# Altium footprint library B105connectors.PcbLib: 71 footprints (part 2 of 5)
Each footprint in its own frame and in the unit in brackets; x right, y up, seen from the top. Pads: shape width x height; smd on the part's side, far side on the other; paste and mask are expansions set on the pad; w line width, h text height; cw(c..) or ccw(c..) is an arc to the next point about the centre after c.
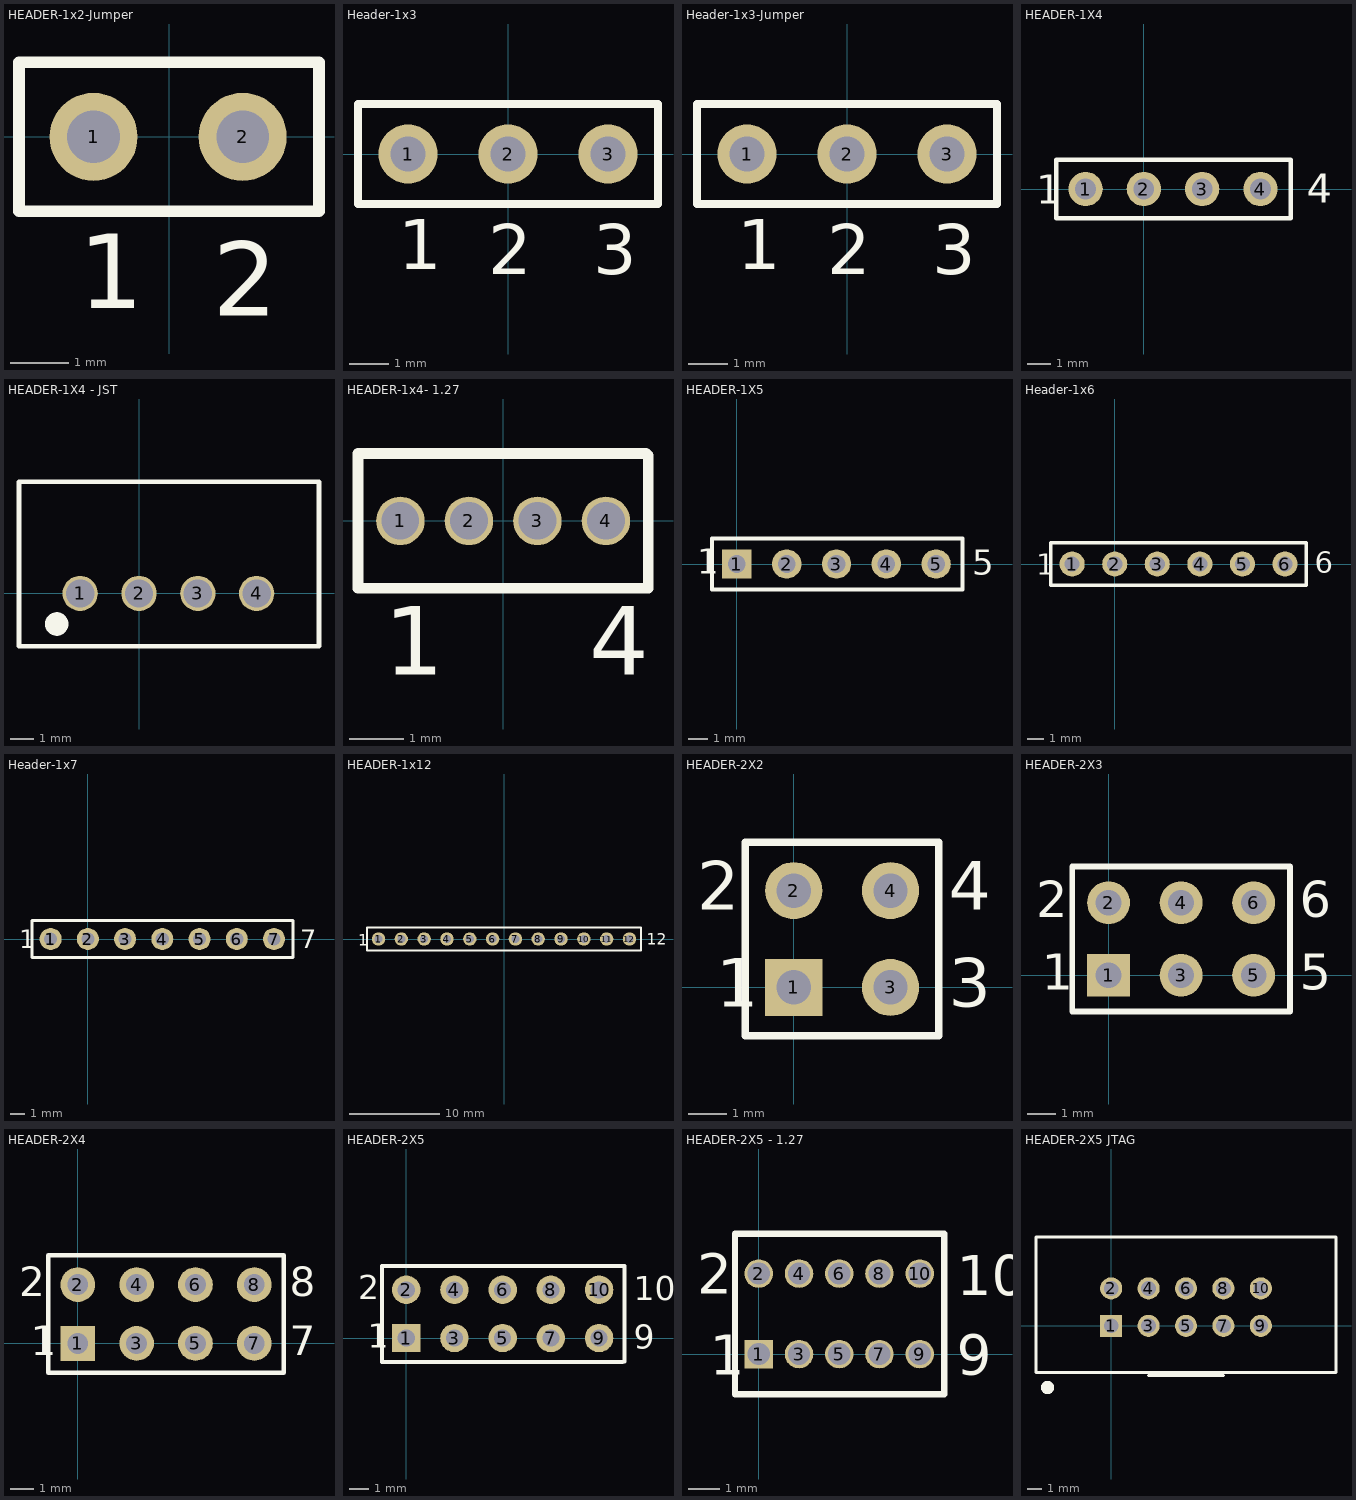
[diagram p1: the footprints below, top view; thin cyan lines are the x and y axes]

## HEADER-1x2-Jumper [mm]
pads (2):
  round 1.5 hole 0.9: 1(-1.29,0) 2(1.25,0)
Top Overlay:
  lines w0.2: -2.56,-1.27 -2.56,1.27 2.55,1.27 2.55,-1.27 -2.56,-1.27
  text "1" at -1.544,-2.921 h1.27
  text "2" at 0.742,-3.048 h1.27
3D body "User Library-Header_Male_1Pin.STEP": height 8.54, standoff -3, extent -0.02,-1.245 2.52,1.245
3D body "User Library-Header_Male_1Pin.STEP": height 8.54, standoff -3, extent -2.57,-1.245 -0.03,1.245
3D body "jumper_aksnt_g-black.stp": height 8.3, standoff 3.8, extent -1.752,-1.22 1.712,1.22

## Header-1x3 [mm]
pads (3):
  round 1.5 hole 0.9: 1(-2.54,0) 2(0,0) 3(2.54,0)
Top Overlay:
  lines w0.2: -3.81,-1.27 3.81,-1.27 3.81,1.27 -3.81,1.27 -3.81,-1.27
  text "3" at 2.159,-3.048 h1.27
  text "2" at -0.508,-3.048 h1.27
  text "1" at -2.794,-2.921 h1.27
3D body "User Library-Header_Male_3Pin.STEP": height 8.54, standoff -3, extent -3.81,-1.22 3.81,1.27

## Header-1x3-Jumper [mm]
pads (3):
  round 1.5 hole 0.9: 1(-2.54,0) 2(0,0) 3(2.54,0)
Top Overlay:
  lines w0.2: -3.81,-1.27 3.81,-1.27 3.81,1.27 -3.81,1.27 -3.81,-1.27
  text "3" at 2.159,-3.048 h1.27
  text "2" at -0.508,-3.048 h1.27
  text "1" at -2.794,-2.921 h1.27
3D body "User Library-Header_Male_3Pin.STEP": height 8.54, standoff -3, extent -3.81,-1.22 3.81,1.27
3D body "jumper_aksnt_g-black.stp": height 8.31, standoff 3.81, extent -0.462,-1.22 3.002,1.22

## HEADER-1X4 [mm]
pads (4):
  round 1.5 hole 0.9: 1(-2.54,0) 2(0,0) 3(2.54,0) 4(5.08,0)
Top Overlay:
  lines w0.2: -3.81,-1.27 -3.81,1.27 6.4,1.27 6.4,-1.27 -3.81,-1.27
  text "4" at 7.1,-0.6 h1.27
  text "1" at -4.699,-0.635 h1.27
3D body "User Library-Header_Male_4Pin.STEP": height 8.54, standoff -3, extent -3.78,-1.3 6.38,1.19

## HEADER-1X4 - JST [mm]
pads (4):
  round 1.5 hole 1.2: 1(-2.5,0) 2(0,0) 3(2.5,0) 4(5,0)
Top Overlay:
  circle w0.5: c-3.5,-1.3 r0.25
  lines w0.2: -5.1,-2.25 -5.1,4.75 7.65,4.75 7.65,-2.25 -5.1,-2.25
3D body "jst-s4b-xh-a.step": height 6.15, standoff -3.35, extent -4.95,-2.3 7.45,9.2

## HEADER-1x4- 1.27 [mm]
pads (4):
  round 0.9 hole 0.7: 1(-1.905,0) 2(-0.635,0) 3(0.635,0) 4(1.905,0)
Top Overlay:
  lines w0.2: -2.69,-1.25 -2.69,1.25 ; -2.65,-1.25 2.65,-1.25 ; -2.65,1.25 2.65,1.25 2.69,1.21 2.69,-1.25
  text "1" at -2.2,-2.85 h1.27
  text "4" at 1.6,-2.85 h1.27

## HEADER-1X5 [mm] "Connector; Header; 5x1 Position"
pads (5):
  rect 1.5x1.5 hole 0.9: 1(0,0)
  round 1.5 hole 0.9: 2(2.54,0) 3(5.08,0) 4(7.62,0) 5(10.16,0)
Top Overlay:
  lines w0.2: -1.27,-1.3 11.5,-1.3 11.5,1.3 -1.27,1.3 -1.27,-1.3
  text "1" at -2.032,-0.508 h1.27
  text "5" at 11.994,-0.558 h1.27
3D body "User Library-Header_Male_RA_Low_5Pin.STEP": height 2.51, standoff -3, extent -1.23,-9.76 11.47,0.37

## Header-1x6 [mm]
pads (6):
  round 1.5 hole 0.9: 1(-2.54,0) 2(0,0) 3(2.54,0) 4(5.08,0) 5(7.62,0) 6(10.16,0)
Top Overlay:
  lines w0.2: -3.81,-1.27 11.43,-1.27 11.43,1.27 -3.81,1.27 -3.81,-1.27
  text "1" at -4.699,-0.635 h1.27
  text "6" at 11.938,-0.508 h1.27
3D body "User Library-Header_Male_3Pin.STEP": height 8.54, standoff -3, extent -3.81,-1.22 3.81,1.27
3D body "User Library-Header_Male_3Pin.STEP": height 8.54, standoff -3, extent 3.81,-1.22 11.43,1.27

## Header-1x7 [mm]
pads (7):
  round 1.5 hole 0.9: 1(-2.54,0) 2(0,0) 3(2.54,0) 4(5.08,0) 5(7.62,0) 6(10.16,0) 7(12.7,0)
Top Overlay:
  lines w0.2: -3.81,-1.27 14,-1.27 14,1.27 -3.81,1.27 -3.81,-1.27
  text "1" at -4.699,-0.635 h1.27
  text "7" at 14.5,-0.635 h1.27
3D body "User Library-Header_Male_3Pin.STEP": height 8.54, standoff -3, extent -3.81,-1.22 3.81,1.27
3D body "User Library-Header_Male_3Pin.STEP": height 8.54, standoff -3, extent 3.81,-1.22 11.43,1.27
3D body "User Library-Header_Male_1Pin.STEP": height 8.54, standoff -3, extent 11.43,-1.29 13.97,1.2

## HEADER-1x12 [mm]
pads (12):
  round 1.5 hole 0.9: 1(-13.97,0) 2(-11.43,0) 3(-8.89,0) 4(-6.35,0) 5(-3.81,0) 6(-1.27,0) 7(1.27,0) 8(3.81,0) 9(6.35,0) 10(8.89,0) 11(11.43,0) 12(13.97,0)
Top Overlay:
  lines w0.2: -15.24,-1.27 -15.24,1.27 15.24,1.27 15.24,-1.27 -15.24,-1.27
  text "12" at 15.875,-0.635 h1.27
  text "1" at -16.256,-0.762 h1.27
3D body "User Library-Header_Male_5Pin.STEP": height 8.54, standoff -3, extent -15.24,-1.245 -2.54,1.245
3D body "User Library-Header_Male_5Pin.STEP": height 8.54, standoff -3, extent -2.54,-1.245 10.16,1.245
3D body "User Library-Header_Male_2Pin.STEP": height 8.54, standoff -3, extent 10.16,-1.245 15.24,1.245

## HEADER-2X2 [mm] "Connector; Header; 2x2 Position"
pads (4):
  rect 1.5x1.5 hole 0.9: 1(0,0)
  round 1.5 hole 0.9: 2(0,2.54) 3(2.54,0) 4(2.54,2.54)
Top Overlay:
  lines w0.2: -1.27,-1.27 3.81,-1.27 3.81,3.81 -1.27,3.81 -1.27,-1.27
  text "3" at 4.064,-0.508 h1.27
  text "4" at 4.064,2.032 h1.27
  text "2" at -2.54,2.032 h1.27
  text "1" at -2.032,-0.508 h1.27
3D body "User Library-Header_Male_1Pin.STEP": height 8.54, standoff -3, extent 1.28,-1.24 3.82,1.25
3D body "User Library-Header_Male_1Pin.STEP": height 8.54, standoff -3, extent -1.27,-1.24 1.27,1.25
3D body "User Library-Header_Male_1Pin.STEP": height 8.54, standoff -3, extent 1.28,1.26 3.82,3.75
3D body "User Library-Header_Male_1Pin.STEP": height 8.54, standoff -3, extent -1.27,1.26 1.27,3.75

## HEADER-2X3 [mm] "Connector; Header; 3x2 Position"
pads (6):
  rect 1.5x1.5 hole 0.9: 1(0,0)
  round 1.5 hole 0.9: 2(0,2.54) 3(2.54,0) 4(2.54,2.54) 5(5.08,0) 6(5.08,2.54)
Top Overlay:
  lines w0.2: -1.27,-1.27 6.35,-1.27 6.35,3.81 -1.27,3.81 -1.27,-1.27
  text "2" at -2.54,2.032 h1.27
  text "1" at -2.332,-0.508 h1.27
  text "5" at 6.694,-0.508 h1.27
  text "6" at 6.694,2.032 h1.27
3D body "User Library-Header_Male_1Pin.STEP": height 8.54, standoff -3, extent -1.27,1.26 1.27,3.75
3D body "User Library-Header_Male_1Pin.STEP": height 8.54, standoff -3, extent 1.28,1.26 3.82,3.75
3D body "User Library-Header_Male_1Pin.STEP": height 8.54, standoff -3, extent -1.27,-1.24 1.27,1.25
3D body "User Library-Header_Male_1Pin.STEP": height 8.54, standoff -3, extent 1.28,-1.24 3.82,1.25
3D body "User Library-Header_Male_1Pin.STEP": height 8.54, standoff -3, extent 3.83,-1.24 6.37,1.25
3D body "User Library-Header_Male_1Pin.STEP": height 8.54, standoff -3, extent 3.83,1.26 6.37,3.75

## HEADER-2X4 [mm] "Connector; Header; 4x2 Position"
pads (8):
  rect 1.5x1.5 hole 0.9: 1(0,0)
  round 1.5 hole 0.9: 2(0,2.54) 3(2.54,0) 4(2.54,2.54) 5(5.08,0) 6(5.08,2.54) 7(7.62,0) 8(7.62,2.54)
Top Overlay:
  lines w0.2: -1.27,-1.27 -1.27,3.81 8.89,3.81 8.89,-1.27 -1.27,-1.27
  text "8" at 9.144,2.032 h1.27
  text "7" at 9.144,-0.508 h1.27
  text "1" at -2.032,-0.508 h1.27
  text "2" at -2.54,2.032 h1.27
3D body "User Library-Header_Male_1Pin.STEP": height 8.54, standoff -3, extent 3.83,1.26 6.37,3.75
3D body "User Library-Header_Male_1Pin.STEP": height 8.54, standoff -3, extent 6.38,1.26 8.92,3.75
3D body "User Library-Header_Male_1Pin.STEP": height 8.54, standoff -3, extent 3.83,-1.24 6.37,1.25
3D body "User Library-Header_Male_1Pin.STEP": height 8.54, standoff -3, extent 6.38,-1.24 8.92,1.25
3D body "User Library-Header_Male_1Pin.STEP": height 8.54, standoff -3, extent 1.28,-1.24 3.82,1.25
3D body "User Library-Header_Male_1Pin.STEP": height 8.54, standoff -3, extent -1.27,-1.24 1.27,1.25
3D body "User Library-Header_Male_1Pin.STEP": height 8.54, standoff -3, extent 1.28,1.26 3.82,3.75
3D body "User Library-Header_Male_1Pin.STEP": height 8.54, standoff -3, extent -1.27,1.26 1.27,3.75

## HEADER-2X5 [mm] "Connector; Header; 4x2 Position"
pads (10):
  rect 1.5x1.5 hole 0.9: 1(0,0)
  round 1.5 hole 0.9: 2(0,2.54) 3(2.54,0) 4(2.54,2.54) 5(5.08,0) 6(5.08,2.54) 7(7.62,0) 8(7.62,2.54) 9(10.16,0) 10(10.16,2.54)
Top Overlay:
  lines w0.2: 11.4,-1.27 -1.27,-1.27 -1.27,3.8 11.5,3.8 11.5,-1.25
  text "2" at -2.54,2.032 h1.27
  text "1" at -2.032,-0.508 h1.27
  text "9" at 11.994,-0.558 h1.27
  text "10" at 11.994,1.982 h1.27
3D body "User Library-Header_Male_1Pin.STEP": height 8.54, standoff -3, extent -1.27,1.26 1.27,3.75
3D body "User Library-Header_Male_1Pin.STEP": height 8.54, standoff -3, extent 1.28,1.26 3.82,3.75
3D body "User Library-Header_Male_1Pin.STEP": height 8.54, standoff -3, extent -1.27,-1.24 1.27,1.25
3D body "User Library-Header_Male_1Pin.STEP": height 8.54, standoff -3, extent 1.28,-1.24 3.82,1.25
3D body "User Library-Header_Male_1Pin.STEP": height 8.54, standoff -3, extent 6.38,-1.24 8.92,1.25
3D body "User Library-Header_Male_1Pin.STEP": height 8.54, standoff -3, extent 3.83,-1.24 6.37,1.25
3D body "User Library-Header_Male_1Pin.STEP": height 8.54, standoff -3, extent 6.38,1.26 8.92,3.75
3D body "User Library-Header_Male_1Pin.STEP": height 8.54, standoff -3, extent 3.83,1.26 6.37,3.75
3D body "User Library-Header_Male_1Pin.STEP": height 8.54, standoff -3, extent 8.93,1.26 11.47,3.75
3D body "User Library-Header_Male_1Pin.STEP": height 8.54, standoff -3, extent 8.93,-1.24 11.47,1.25

## HEADER-2X5 - 1.27 [mm] "Connector; Header; 4x2 Position"
pads (10):
  rect 0.9x0.9 hole 0.7: 1(0,0)
  round 0.9 hole 0.7: 2(0,2.54) 3(1.27,0) 4(1.27,2.54) 5(2.54,0) 6(2.54,2.54) 7(3.81,0) 8(3.81,2.54) 9(5.08,0) 10(5.08,2.54)
Top Overlay:
  lines w0.2: -0.75,-1.27 -0.75,3.8 5.85,3.8 5.85,-1.27 -0.75,-1.27
  text "10" at 6.25,1.85 h1.27
  text "9" at 6.25,-0.65 h1.27
  text "1" at -1.55,-0.65 h1.27
  text "2" at -1.95,1.9 h1.27

## HEADER-2X5 JTAG [mm] "Connector; Header; 5x2 Position"
height 9.5
pads (10):
  rect 1.5x1.5 hole 1: 1(0,0)
  round 1.5 hole 1: 2(0,2.54) 3(2.54,0) 4(2.54,2.54) 5(5.08,0) 6(5.08,2.54) 7(7.62,0) 8(7.62,2.54) 9(10.16,0) 10(10.16,2.54)
Top Overlay:
  circle w0.45: c-4.32,-4.19 r0.227
  lines w0.2: 2.54,-3.38 7.62,-3.38 ; -5.1,-3.18 -5.1,6.02 15.26,6.02 15.26,-3.18 -5.1,-3.18
3D body "JTAG_BH-10.step": height 9.14, standoff -3, extent -5.1,-3.18 15.26,6.02